# Altium footprint library hallglib.PcbLib: 98 footprints (part 6 of 7)
Each footprint in its own frame and in the unit in brackets; x right, y up, seen from the top. Pads: shape width x height; smd on the part's side, far side on the other; paste and mask are expansions set on the pad; w line width, h text height; cw(c..) or ccw(c..) is an arc to the next point about the centre after c.
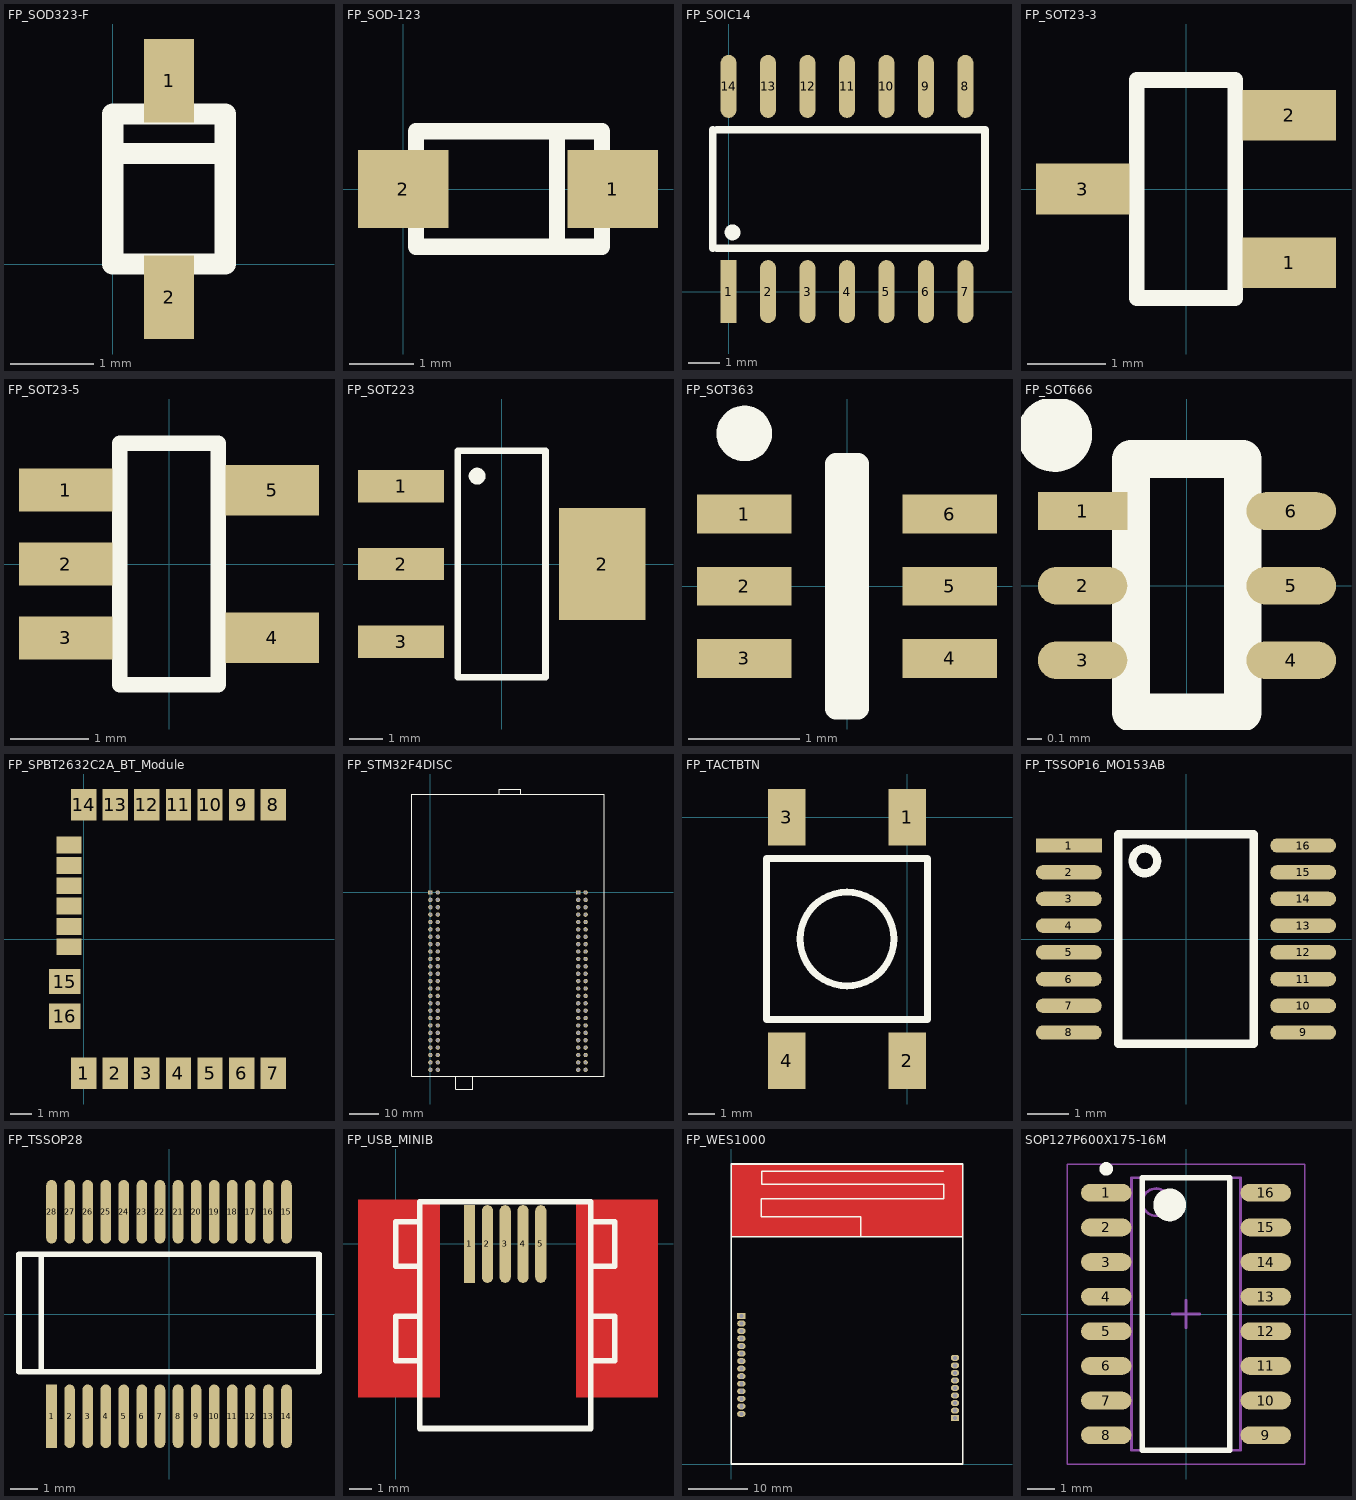
[diagram p5: the footprints below, top view; thin cyan lines are the x and y axes]

## FP_SOD323-F [mm] "SOD323-F (SC-90)"
height 0.8
pads (2):
  rect 0.6x1 smd: 1(0.675,2.2) 2(0.675,-0.4)
Top Overlay:
  lines w0.254: 0,1.325 1.35,1.325 ; 0,0 0,1.8 1.35,1.8 1.35,0 0,0
3D body "SOD-323F.STEP": height 0.79, standoff -0.08, extent 0.022,-0.461 1.372,2.239

## FP_SOD-123 [mm]
height 1.168
pads (2):
  rect 1.41x1.22 smd: 1(3.27,0) 2(0,0)
Top Overlay:
  lines w0.254: 2.4,-0.9 2.4,0.9 ; 0.2,-0.9 0.2,0.9 3.1,0.9 3.1,-0.9 0.2,-0.9
3D body "SOD-123_DiodesInc.STEP": height 1.47, standoff 0.02, extent -0.3,-0.85 3.55,0.85

## FP_SOIC14 [mil] "SOIC-14 egyesek szerint narrow, RET szerint normál"
height 69
pads (14):
  rect 20x80 smd: 1(0,0)
  oval 20x80 smd: 2(50,0) 3(100,0) 4(150,0) 5(200,0) 6(250,0) 7(300,0) 8(300,260) 9(250,260) 10(200,260) 11(150,260) 12(100,260) 13(50,260) 14(0,260)
Top Overlay:
  circle w10: c5,75 r5
  lines w10: -20,55 -20,205 ; -15,55 325,55 325,205 -15,205
3D body "SOIC14N.STEP": height 62.99, standoff 0, extent -22.25,9.8 322.24,248.21

## FP_SOT23-3 [mm] "SOT23-3 tok"
height 1.1
pads (3):
  rect 1.2x0.65 smd: 1(1.327,-0.95) 2(1.327,0.95) 3(-1.327,0)
Top Overlay:
  lines w0.2: -0.635,-1.4 -0.635,1.4 0.635,1.4 0.635,-1.4 -0.635,-1.4
3D body "SOT-23.STEP": height 0.97, standoff -0.01, extent -1.274,-1.46 1.274,1.46

## FP_SOT23-5 [mm] "SOT23, 5-Leads, Body 2.9x1.6mm, Pitch 0.95mm, Lead Span 2.8mm, IPC Medium Density"
height 1.19
pads (5):
  rect 1.2x0.55 smd mask+0.05: 1(-1.327,0.95) 2(-1.327,0) 3(-1.327,-0.95)
  rect 1.2x0.65 smd: 4(1.327,-0.95) 5(1.327,0.95)
Top Overlay:
  lines w0.2: -0.635,-1.55 0.635,-1.55 0.635,1.55 -0.635,1.55 -0.635,-1.55
3D body "SOT-23-5.STEP": height 1, standoff 0, extent -1.17,-1.46 1.17,1.46

## FP_SOT223 [mm] "SOT223 package, 3 leads"
height 1.8
pads (4):
  rect 2.55x0.95 smd: 1(-2.975,2.3) 2(-2.975,0) 3(-2.975,-2.3)
  rect 2.55x3.3 smd: 2(2.975,0)
Top Overlay:
  circle w0.25: c-0.725,2.6 r0.125
  lines w0.2: -1.3,-3.35 -1.3,3.35 1.3,3.35 1.3,-3.35 -1.3,-3.35
3D body "SOT-223-1.STEP": height 1.65, standoff 0, extent -3.5,-3.25 3.5,3.25

## FP_SOT363 [mm] "SOT363 (SC-88) package 6 leads"
height 1.1
pads (6):
  rect 0.85x0.35 smd: 1(-0.925,0.65) 2(-0.925,0) 3(-0.925,-0.65) 4(0.925,-0.65) 5(0.925,0) 6(0.925,0.65)
Top Overlay:
  circle w0.25: c-0.925,1.375 r0.125
  lines w0.2: -0.1,-1.1 -0.1,1.1 0.1,1.1 0.1,-1.1 -0.1,-1.1
3D body "SOT363.STEP": height 0.98, standoff -0.01, extent -1.05,-1 1.05,1

## FP_SOT666 [mm] "SOT666 package"
height 0.6
pads (6):
  rect 0.6x0.254 smd: 1(-0.7,0.5)
  oval 0.6x0.254 smd: 2(-0.7,0) 3(-0.7,-0.5) 4(0.7,-0.5) 5(0.7,0) 6(0.7,0.5)
Top Overlay:
  circle w0.254: c-0.887,1.016 r0.125
  lines w0.254: -0.375,-0.85 -0.375,0.85 0.375,0.85 0.375,-0.85 -0.375,-0.85
3D body: height 0.55, standoff 0, extent -0.6,-0.8 0.6,0.8
3D body: height 0.13, standoff 0, extent 0.6,-0.11 0.8,0.11
3D body: height 0.13, standoff 0, extent 0.6,-0.61 0.8,-0.39
3D body: height 0.13, standoff 0, extent 0.6,0.39 0.8,0.61
3D body: height 0.13, standoff 0, extent -0.8,0.39 -0.6,0.61
3D body: height 0.13, standoff 0, extent -0.8,-0.11 -0.6,0.11
3D body: height 0.13, standoff 0, extent -0.8,-0.61 -0.6,-0.39

## FP_SPBT2632C2A_BT_Module [mm] "Bluetooth technology class-2 module"
height 2.9
pads (22):
  rect 1.2x1.5 smd: 1(0,-6.37) 2(1.5,-6.37) 3(3,-6.37) 4(4.5,-6.37) 5(6,-6.37) 6(7.5,-6.37) 7(9,-6.37) 8(9,6.37) 9(7.5,6.37) 10(6,6.37) 11(4.5,6.37) 12(3,6.37) 13(1.5,6.37) 14(0,6.37)
  rect 1.5x1.2 smd: 15(-0.9,-2.02) 16(-0.9,-3.67)
  rect 1.2x0.8 smd: ""(-0.7,-0.37) ""(-0.7,0.595) ""(-0.7,1.56) ""(-0.7,2.525) ""(-0.7,3.49) ""(-0.7,4.455)
3D body: height 1.5, standoff 0, extent -1.228,-6.75 10.372,6.75

## FP_STM32F4DISC [mm] "STM32 F4 Discovery evaluation board"
pads (100):
  rect 1.5x1.5 hole 1.1: 1(0,0) 51(50.8,0)
  round 1.5 hole 1.1: 2(2.54,0) 3(0,-2.54) 4(2.54,-2.54) 5(0,-5.08) 6(2.54,-5.08) 7(0,-7.62) 8(2.54,-7.62) 9(0,-10.16) 10(2.54,-10.16) 11(0,-12.7) 12(2.54,-12.7) 13(0,-15.24) 14(2.54,-15.24) 15(0,-17.78) 16(2.54,-17.78) 17(0,-20.32) 18(2.54,-20.32) 19(0,-22.86) 20(2.54,-22.86) 21(0,-25.4) 22(2.54,-25.4) 23(0,-27.94) 24(2.54,-27.94) 25(0,-30.48) 26(2.54,-30.48) 27(0,-33.02) 28(2.54,-33.02) 29(0,-35.56) 30(2.54,-35.56) 31(0,-38.1) 32(2.54,-38.1) 33(0,-40.64) 34(2.54,-40.64) 35(0,-43.18) 36(2.54,-43.18) 37(0,-45.72) 38(2.54,-45.72) 39(0,-48.26) 40(2.54,-48.26) 41(0,-50.8) 42(2.54,-50.8) 43(0,-53.34) 44(2.54,-53.34) 45(0,-55.88) 46(2.54,-55.88) 47(0,-58.42) 48(2.54,-58.42) 49(0,-60.96) 50(2.54,-60.96) 52(53.34,0) 53(50.8,-2.54) 54(53.34,-2.54) 55(50.8,-5.08) 56(53.34,-5.08) 57(50.8,-7.62) 58(53.34,-7.62) 59(50.8,-10.16) 60(53.34,-10.16) 61(50.8,-12.7) 62(53.34,-12.7) 63(50.8,-15.24) 64(53.34,-15.24) 65(50.8,-17.78) 66(53.34,-17.78) 67(50.8,-20.32) 68(53.34,-20.32) 69(50.8,-22.86) 70(53.34,-22.86) 71(50.8,-25.4) 72(53.34,-25.4) 73(50.8,-27.94) 74(53.34,-27.94) 75(50.8,-30.48) 76(53.34,-30.48) 77(50.8,-33.02) 78(53.34,-33.02) 79(50.8,-35.56) 80(53.34,-35.56) 81(50.8,-38.1) 82(53.34,-38.1) 83(50.8,-40.64) 84(53.34,-40.64) 85(50.8,-43.18) 86(53.34,-43.18) 87(50.8,-45.72) 88(53.34,-45.72) 89(50.8,-48.26) 90(53.34,-48.26) 91(50.8,-50.8) 92(53.34,-50.8) 93(50.8,-53.34) 94(53.34,-53.34) 95(50.8,-55.88) 96(53.34,-55.88) 97(50.8,-58.42) 98(53.34,-58.42) 99(50.8,-60.96) 100(53.34,-60.96)
Top Overlay:
  lines w0.254: 8.636,-63.18 8.636,-67.564 14.605,-67.564 14.605,-63.18 ; 20.574,33.82 23.622,33.82 23.622,35.56 30.988,35.56 30.988,33.82 ; -6.33,-63.18 -6.33,33.82 59.67,33.82 59.67,-63.18 -6.33,-63.18
3D body: height 22.59, standoff 16.61, extent 8.569,-67.691 14.545,-63.261
3D body: height 24.6, standoff 16.6, extent 8.382,-63.119 16.51,-49.403
3D body: height 16.6, standoff 9, extent -6.33,-63.18 59.67,35.56
3D body: height 22.6, standoff 16.6, extent 36.376,-33.995 40.858,-29.504
3D body: height 22.6, standoff 16.6, extent 12.618,-34.036 17.1,-29.545
3D body: height 20.6, standoff 16.6, extent -1.27,8.636 1.143,23.622
3D body: height 20.6, standoff 16.6, extent 10.414,-11.049 12.446,-6.35
3D body: height 20.6, standoff 16.6, extent 39.688,8.065 42.355,18.098
3D body: height 9, standoff 0, extent -1.27,-62.23 3.81,1.27
3D body: height 9, standoff 0, extent 49.53,-62.23 54.61,1.27
3D body: height 9, standoff 2, extent -1.27,26.67 1.27,31.75
3D body: height 9, standoff 2, extent 52.07,26.67 54.61,31.75
3D body: height 0, standoff -3.2, extent -0.2,-0.325 0.2,0.325
3D body: height 0, standoff -3.2, extent -0.2,-2.865 0.2,-2.215
3D body: height 0, standoff -3.2, extent -0.2,-5.405 0.2,-4.755
3D body: height 0, standoff -3.2, extent -0.2,-7.945 0.2,-7.295
3D body: height 0, standoff -3.2, extent -0.2,-10.485 0.2,-9.835
3D body: height 0, standoff -3.2, extent -0.2,-13.025 0.2,-12.375
3D body: height 0, standoff -3.2, extent -0.2,-15.565 0.2,-14.915
3D body: height 0, standoff -3.2, extent -0.2,-18.105 0.2,-17.455
3D body: height 0, standoff -3.2, extent -0.2,-20.645 0.2,-19.995
3D body: height 0, standoff -3.2, extent -0.2,-23.185 0.2,-22.535
3D body: height 0, standoff -3.2, extent -0.2,-25.725 0.2,-25.075
3D body: height 0, standoff -3.2, extent -0.2,-28.265 0.2,-27.615
3D body: height 0, standoff -3.2, extent -0.2,-30.805 0.2,-30.155
3D body: height 0, standoff -3.2, extent -0.2,-33.345 0.2,-32.695
3D body: height 0, standoff -3.2, extent -0.2,-35.885 0.2,-35.235
3D body: height 0, standoff -3.2, extent -0.2,-38.425 0.2,-37.775
3D body: height 0, standoff -3.2, extent -0.2,-40.965 0.2,-40.315
3D body: height 0, standoff -3.2, extent -0.2,-43.505 0.2,-42.855
3D body: height 0, standoff -3.2, extent -0.2,-46.045 0.2,-45.395
3D body: height 0, standoff -3.2, extent -0.2,-48.585 0.2,-47.935
3D body: height 0, standoff -3.2, extent -0.2,-51.125 0.2,-50.475
3D body: height 0, standoff -3.2, extent -0.2,-53.665 0.2,-53.015
3D body: height 0, standoff -3.2, extent -0.2,-56.205 0.2,-55.555
3D body: height 0, standoff -3.2, extent -0.2,-58.745 0.2,-58.095
3D body: height 0, standoff -3.2, extent -0.2,-61.285 0.2,-60.635
3D body: height 0, standoff -3.2, extent 2.34,-0.325 2.74,0.325
3D body: height 0, standoff -3.2, extent 2.34,-2.865 2.74,-2.215
3D body: height 0, standoff -3.2, extent 2.34,-5.405 2.74,-4.755
3D body: height 0, standoff -3.2, extent 2.34,-7.945 2.74,-7.295
3D body: height 0, standoff -3.2, extent 2.34,-10.485 2.74,-9.835
3D body: height 0, standoff -3.2, extent 2.34,-13.025 2.74,-12.375
3D body: height 0, standoff -3.2, extent 2.34,-15.565 2.74,-14.915
3D body: height 0, standoff -3.2, extent 2.34,-18.105 2.74,-17.455
3D body: height 0, standoff -3.2, extent 2.34,-20.645 2.74,-19.995
3D body: height 0, standoff -3.2, extent 2.34,-23.185 2.74,-22.535
3D body: height 0, standoff -3.2, extent 2.34,-25.725 2.74,-25.075
3D body: height 0, standoff -3.2, extent 2.34,-28.265 2.74,-27.615
3D body: height 0, standoff -3.2, extent 2.34,-30.805 2.74,-30.155
3D body: height 0, standoff -3.2, extent 2.34,-33.345 2.74,-32.695
3D body: height 0, standoff -3.2, extent 2.34,-35.885 2.74,-35.235
3D body: height 0, standoff -3.2, extent 2.34,-38.425 2.74,-37.775
3D body: height 0, standoff -3.2, extent 2.34,-40.965 2.74,-40.315
3D body: height 0, standoff -3.2, extent 2.34,-43.505 2.74,-42.855
3D body: height 0, standoff -3.2, extent 2.34,-46.045 2.74,-45.395
3D body: height 0, standoff -3.2, extent 2.34,-48.585 2.74,-47.935
3D body: height 0, standoff -3.2, extent 2.34,-51.125 2.74,-50.475
3D body: height 0, standoff -3.2, extent 2.34,-53.665 2.74,-53.015
3D body: height 0, standoff -3.2, extent 2.34,-56.205 2.74,-55.555
3D body: height 0, standoff -3.2, extent 2.34,-58.745 2.74,-58.095
3D body: height 0, standoff -3.2, extent 2.34,-61.285 2.74,-60.635
3D body: height 0, standoff -3.2, extent 50.6,-0.325 51,0.325
3D body: height 0, standoff -3.2, extent 50.6,-2.865 51,-2.215
3D body: height 0, standoff -3.2, extent 50.6,-5.405 51,-4.755
3D body: height 0, standoff -3.2, extent 50.6,-7.945 51,-7.295
3D body: height 0, standoff -3.2, extent 50.6,-10.485 51,-9.835
3D body: height 0, standoff -3.2, extent 50.6,-13.025 51,-12.375
3D body: height 0, standoff -3.2, extent 50.6,-15.565 51,-14.915
3D body: height 0, standoff -3.2, extent 50.6,-18.105 51,-17.455
3D body: height 0, standoff -3.2, extent 50.6,-20.645 51,-19.995
3D body: height 0, standoff -3.2, extent 50.6,-23.185 51,-22.535
3D body: height 0, standoff -3.2, extent 50.6,-25.725 51,-25.075
3D body: height 0, standoff -3.2, extent 50.6,-28.265 51,-27.615
3D body: height 0, standoff -3.2, extent 50.6,-30.805 51,-30.155
3D body: height 0, standoff -3.2, extent 50.6,-33.345 51,-32.695
3D body: height 0, standoff -3.2, extent 50.6,-35.885 51,-35.235
3D body: height 0, standoff -3.2, extent 50.6,-38.425 51,-37.775
3D body: height 0, standoff -3.2, extent 50.6,-40.965 51,-40.315
3D body: height 0, standoff -3.2, extent 50.6,-43.505 51,-42.855
3D body: height 0, standoff -3.2, extent 50.6,-46.045 51,-45.395
3D body: height 0, standoff -3.2, extent 50.6,-48.585 51,-47.935
3D body: height 0, standoff -3.2, extent 50.6,-51.125 51,-50.475
3D body: height 0, standoff -3.2, extent 50.6,-53.665 51,-53.015
3D body: height 0, standoff -3.2, extent 50.6,-56.205 51,-55.555
3D body: height 0, standoff -3.2, extent 50.6,-58.745 51,-58.095
3D body: height 0, standoff -3.2, extent 50.6,-61.285 51,-60.635
3D body: height 0, standoff -3.2, extent 53.14,-0.325 53.54,0.325
3D body: height 0, standoff -3.2, extent 53.14,-2.865 53.54,-2.215
3D body: height 0, standoff -3.2, extent 53.14,-5.405 53.54,-4.755
3D body: height 0, standoff -3.2, extent 53.14,-7.945 53.54,-7.295
3D body: height 0, standoff -3.2, extent 53.14,-10.485 53.54,-9.835
3D body: height 0, standoff -3.2, extent 53.14,-13.025 53.54,-12.375
3D body: height 0, standoff -3.2, extent 53.14,-15.565 53.54,-14.915
3D body: height 0, standoff -3.2, extent 53.14,-18.105 53.54,-17.455
3D body: height 0, standoff -3.2, extent 53.14,-20.645 53.54,-19.995
3D body: height 0, standoff -3.2, extent 53.14,-23.185 53.54,-22.535
3D body: height 0, standoff -3.2, extent 53.14,-25.725 53.54,-25.075
3D body: height 0, standoff -3.2, extent 53.14,-28.265 53.54,-27.615
3D body: height 0, standoff -3.2, extent 53.14,-30.805 53.54,-30.155
3D body: height 0, standoff -3.2, extent 53.14,-33.345 53.54,-32.695
3D body: height 0, standoff -3.2, extent 53.14,-35.885 53.54,-35.235
3D body: height 0, standoff -3.2, extent 53.14,-38.425 53.54,-37.775
3D body: height 0, standoff -3.2, extent 53.14,-40.965 53.54,-40.315
3D body: height 0, standoff -3.2, extent 53.14,-43.505 53.54,-42.855
3D body: height 0, standoff -3.2, extent 53.14,-46.045 53.54,-45.395
3D body: height 0, standoff -3.2, extent 53.14,-48.585 53.54,-47.935
3D body: height 0, standoff -3.2, extent 53.14,-51.125 53.54,-50.475
3D body: height 0, standoff -3.2, extent 53.14,-53.665 53.54,-53.015
3D body: height 0, standoff -3.2, extent 53.14,-56.205 53.54,-55.555
3D body: height 0, standoff -3.2, extent 53.14,-58.745 53.54,-58.095
3D body: height 0, standoff -3.2, extent 53.14,-61.285 53.54,-60.635

## FP_TACTBTN [mm] "TE CONNECTIVITY / ALCOSWITCH - FSM2JSMA"
height 4.44
pads (4):
  rect 1.4x2.1 smd: 1(0,0) 2(0,-9.1) 3(-4.5,0) 4(-4.5,-9.1)
Top Overlay:
  circle w0.254: c-2.25,-4.55 r1.75
  lines w0.254: -5.25,-7.55 0.75,-7.55 0.75,-1.55 -5.25,-1.55 -5.25,-7.55
3D body "TACT_SMD_6X6.STEP": height 5, standoff -0.05, extent -5.225,-8.575 0.775,-0.425

## FP_TSSOP16_MO153AB [mm] "TSSOP 16 lead JEDEC MO153AB, Analog Devices RU-16"
height 1.2
pads (16):
  rect 1.6x0.35 smd: 1(-2.85,2.275)
  oval 1.6x0.35 smd: 2(-2.85,1.625) 3(-2.85,0.975) 4(-2.85,0.325) 5(-2.85,-0.325) 6(-2.85,-0.975) 7(-2.85,-1.625) 8(-2.85,-2.275) 9(2.85,-2.275) 10(2.85,-1.625) 11(2.85,-0.975) 12(2.85,-0.325) 13(2.85,0.325) 14(2.85,0.975) 15(2.85,1.625) 16(2.85,2.275)
Top Overlay:
  circle w0.2: c-1,1.9 r0.3
  lines w0.2: -1.65,-2.55 -1.65,2.55 1.65,2.55 1.65,-2.55 -1.65,-2.55
3D body "TSSOP16-MO153AB.STEP": height 1.35, standoff 0, extent -3.228,-2.56 3.228,2.54

## FP_TSSOP28 [mil] "TSSOP28 tokozás"
height 78.74
pads (28):
  rect 15x90 smd: 1(-166.4,-144.83)
  oval 15x90 smd: 2(-140.8,-144.83) 3(-115.2,-144.83) 4(-89.6,-144.83) 5(-64,-144.83) 6(-38.4,-144.83) 7(-12.8,-144.83) 8(12.8,-144.83) 9(38.4,-144.83) 10(64,-144.83) 11(89.6,-144.83) 12(115.2,-144.83) 13(140.8,-144.83) 14(166.4,-144.83) 15(166.4,144.83) 16(140.8,144.83) 17(115.2,144.83) 18(89.6,144.83) 19(64,144.83) 20(38.4,144.83) 21(12.8,144.83) 22(-12.8,144.83) 23(-38.4,144.83) 24(-64,144.83) 25(-89.6,144.83) 26(-115.2,144.83) 27(-140.8,144.83) 28(-166.4,144.83)
Top Overlay:
  lines w8: -181,-81.86 -181,84.83 ; -212.5,-81.86 212.5,-81.86 212.5,84.83 -212.5,84.83 -212.5,-81.86
3D body "TSSOP28-MSA28.STEP": height 84.65, standoff 0, extent -202.76,-154.63 202.76,154.65

## FP_USB_MINIB [mm] "MINI USB csatlakozó"
height 3.9
pads (5):
  rect 0.5x3.5 smd: 1(3.325,0)
  oval 0.5x3.5 smd: 2(4.125,0) 3(4.925,0) 4(5.725,0) 5(6.525,0)
Top Layer:
  rectangle: 8.1,-6.9 11.8,2
  rectangle: -1.7,-6.9 2,2
Top Overlay:
  lines w0.254: 1.075,-5.25 0,-5.25 0,-3.25 1.075,-3.25 ; 1.075,-1 0,-1 0,1 1.075,1 ; 8.775,-5.25 9.85,-5.25 9.85,-3.25 8.775,-3.25 ; 8.775,-1 9.85,-1 9.85,1 8.775,1 ; 1.075,-8.3 8.775,-8.3 8.775,1.9 1.075,1.9 1.075,-8.3
Top Solder:
  rectangle: 8.8,-5.95 10.8,-2.45
  rectangle: 8.8,-1.75 10.8,1.75
  rectangle: -1,-6.05 1,-2.55
  rectangle: -1,-1.75 1,1.75
3D body "USBBMINI.STEP": height 4, standoff -0.05, extent 0.003,-8.335 9.903,0.665

## FP_WES1000 [mm]
height 2
pads (23):
  rect 1.4x1 hole 0.7 mask+0.1: 1(1.676,24.968) 15(37.719,7.747)
  oval 1.4x1 hole 0.7 mask+0.1: 2(1.676,23.698) 3(1.676,22.428) 4(1.676,21.158) 5(1.676,19.888) 6(1.676,18.618) 7(1.676,17.348) 8(1.676,16.078) 9(1.676,14.808) 10(1.676,13.538) 11(1.676,12.268) 12(1.676,10.998) 13(1.676,9.728) 14(1.676,8.458) 16(37.719,9.017) 17(37.719,10.287) 18(37.719,11.557) 19(37.719,12.827) 20(37.719,14.097) 21(37.719,15.367) 22(37.719,16.637) 23(37.719,17.907)
Top Layer:
  pour cut-out: 0,38.3 0,50.6 39,50.6 39,38.3
Bottom Layer:
  pour cut-out: 0,38.3 0,50.6 39,50.6 39,38.3
Top Overlay:
  lines w0.254: 0,38.3 39,38.3 ; 21.8,38.3 21.8,41.7 5,41.7 5,44.7 35.8,44.7 35.8,47.2 5.1,47.2 5.1,49.4 35.7,49.4 ; 0,0 0,50.6 39,50.6 39,0 0,0
Bottom Overlay:
  lines w0.2: 0.576,7.768 0.576,25.758 ; 2.776,7.768 2.776,25.758 ; 36.619,6.957 36.619,18.447 ; 38.819,6.957 38.819,18.447
3D body: height 2, standoff 0, extent -0.127,-0.127 39.127,50.727

## SOP127P600X175-16M [mm] "SOP, 16-Leads, Body 9,90x3,90mm, Pitch 1,27mm, IPC Low Density"
height 1.75
pads (16):
  oval 1.85x0.65 smd: 1(-2.925,4.445) 2(-2.925,3.175) 3(-2.925,1.905) 4(-2.925,0.635) 5(-2.925,-0.635) 6(-2.925,-1.905) 7(-2.925,-3.175) 8(-2.925,-4.445) 9(2.925,-4.445) 10(2.925,-3.175) 11(2.925,-1.905) 12(2.925,-0.635) 13(2.925,0.635) 14(2.925,1.905) 15(2.925,3.175) 16(2.925,4.445)
Top Overlay:
  circle w0.25: c-2.925,5.32 r0.125
  circle w0.6: c-0.6,4 r0.3
  lines w0.2: -1.6,-5 -1.6,5 1.6,5 1.6,-5 -1.6,-5
Mechanical 13:
  circle w0.1: c-1.1,4.1 r0.5
  lines w0.1: -2,-5 -2,5 2,5 2,-5 -2,-5
Mechanical 15:
  lines w0.05: -4.35,-5.5 -4.35,5.5 4.35,5.5 4.35,-5.5 -4.35,-5.5
  lines w0.1: -0.5,0 0.5,0 ; 0,-0.5 0,0.5
3D body "SOP127P600X175-16M.step": height 1.75, standoff 0, extent -3,-5 3,5